# Altium integrated library HCxx.IntLib: 212 symbols (part 1 of 2)
Pins are listed as number, name and electrical type; pins without a type are passive.

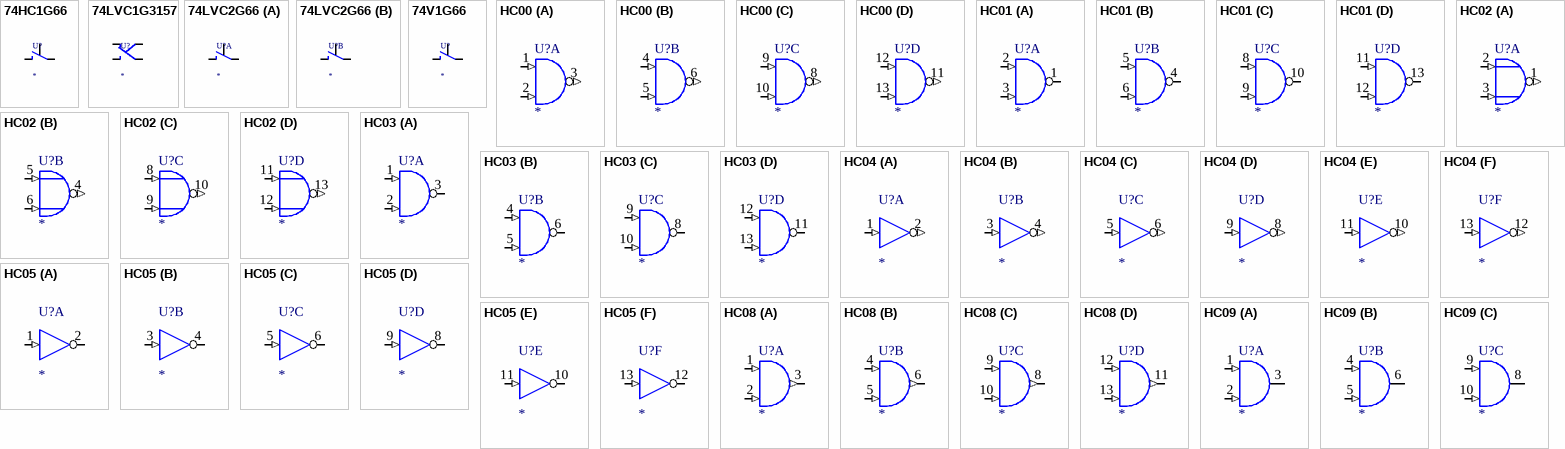
[diagram p0: symbols 74HC1G66 to HC09]

## 74HC1G66
designator U?
2-10V 75om(2V) 21om(9V)
footprint SOT353 (SOT-353/SC-88A; 5 Leads; Body 2.2 x 2.2 mm, inc. leads (LxW max))
pins: 1 y, 2 Z, 3 Vss hidden to Vss, 4 E, 5 Vcc hidden to Vcc
1 alternate drawing of the same symbol

## 74LVC1G3157
designator U?
1.65-5.5V 6om(4.5V)
footprint SOT23-6
pins: 1 0, 2 Vss hidden to Vss, 3 1, 4 Z, 5 Vcc hidden to Vcc, 6 E
1 alternate drawing of the same symbol

## 74LVC2G66
designator U?
2-5.5V 8.5om(3.3V) 6.5om(5V)
footprint SOT23-8L
part A pins: 1 y, 2 Z, 4 Vss hidden to Vss, 7 E, 8 Vcc hidden to Vcc
part B pins: 3 E, 5 y, 6 Z
1 alternate drawing of the same symbol

## 74V1G66
designator U?
2-5.5V 8.5om(3.3V) 6.5om(5V)
footprint SOT23-5
pins: 1 y, 2 Z, 3 Vss hidden to Vss, 4 E, 5 Vcc hidden to Vcc
1 alternate drawing of the same symbol

## HC00
designator U?
footprint DIL14-300
part A pins: 1 I0 (in), 2 I1 (in), 3 O (out), 7 GND (power) hidden to GND, 14 VCC (power) hidden to VCC
part B pins: 4 I0 (in), 5 I1 (in), 6 O (out)
part C pins: 8 O (out), 9 I0 (in), 10 I1 (in)
part D pins: 11 O (out), 12 I0 (in), 13 I1 (in)
1 alternate drawing of the same symbol

## HC01
designator U?
footprint DIL14-300
part A pins: 1 O (oc), 2 I0 (in), 3 I1 (in), 7 GND (power) hidden to GND, 14 VCC (power) hidden to VCC
part B pins: 4 O (oc), 5 I0 (in), 6 I1 (in)
part C pins: 8 I0 (in), 9 I1 (in), 10 O (oc)
part D pins: 11 I0 (in), 12 I1 (in), 13 O (oc)
1 alternate drawing of the same symbol

## HC02
designator U?
footprint DIL14-300
part A pins: 1 O (out), 2 I0 (in), 3 I1 (in), 7 GND (power) hidden to GND, 14 VCC (power) hidden to VCC
part B pins: 4 O (out), 5 I0 (in), 6 I1 (in)
part C pins: 8 I0 (in), 9 I1 (in), 10 O (out)
part D pins: 11 I0 (in), 12 I1 (in), 13 O (out)
1 alternate drawing of the same symbol

## HC03
designator U?
footprint DIL14-300
part A pins: 1 I0 (in), 2 I1 (in), 3 O (oc), 7 GND (power) hidden to GND, 14 VCC (power) hidden to VCC
part B pins: 4 I0 (in), 5 I1 (in), 6 O (oc)
part C pins: 8 O (oc), 9 I0 (in), 10 I1 (in)
part D pins: 11 O (oc), 12 I0 (in), 13 I1 (in)
1 alternate drawing of the same symbol

## HC04
designator U?
footprint DIL14-300
part A pins: 1 I (in), 2 O (out), 7 GND (power) hidden to GND, 14 VCC (power) hidden to VCC
part B pins: 3 I (in), 4 O (out)
part C pins: 5 I (in), 6 O (out)
part D pins: 8 O (out), 9 I (in)
part E pins: 10 O (out), 11 I (in)
part F pins: 12 O (out), 13 I (in)
1 alternate drawing of the same symbol

## HC05
designator U?
footprint DIL14-300
part A pins: 1 I (in), 2 O (oc), 7 GND (power) hidden to GND, 14 VCC (power) hidden to VCC
part B pins: 3 I (in), 4 O (oc)
part C pins: 5 I (in), 6 O (oc)
part D pins: 8 O (oc), 9 I (in)
part E pins: 10 O (oc), 11 I (in)
part F pins: 12 O (oc), 13 I (in)
1 alternate drawing of the same symbol

## HC08
designator U?
Price: 0.34
footprint DIL14-300
part A pins: 1 I0 (in), 2 I1 (in), 3 O (out), 7 GND (power) hidden to GND, 14 VCC (power) hidden to VCC
part B pins: 4 I0 (in), 5 I1 (in), 6 O (out)
part C pins: 8 O (out), 9 I0 (in), 10 I1 (in)
part D pins: 11 O (out), 12 I0 (in), 13 I1 (in)
1 alternate drawing of the same symbol

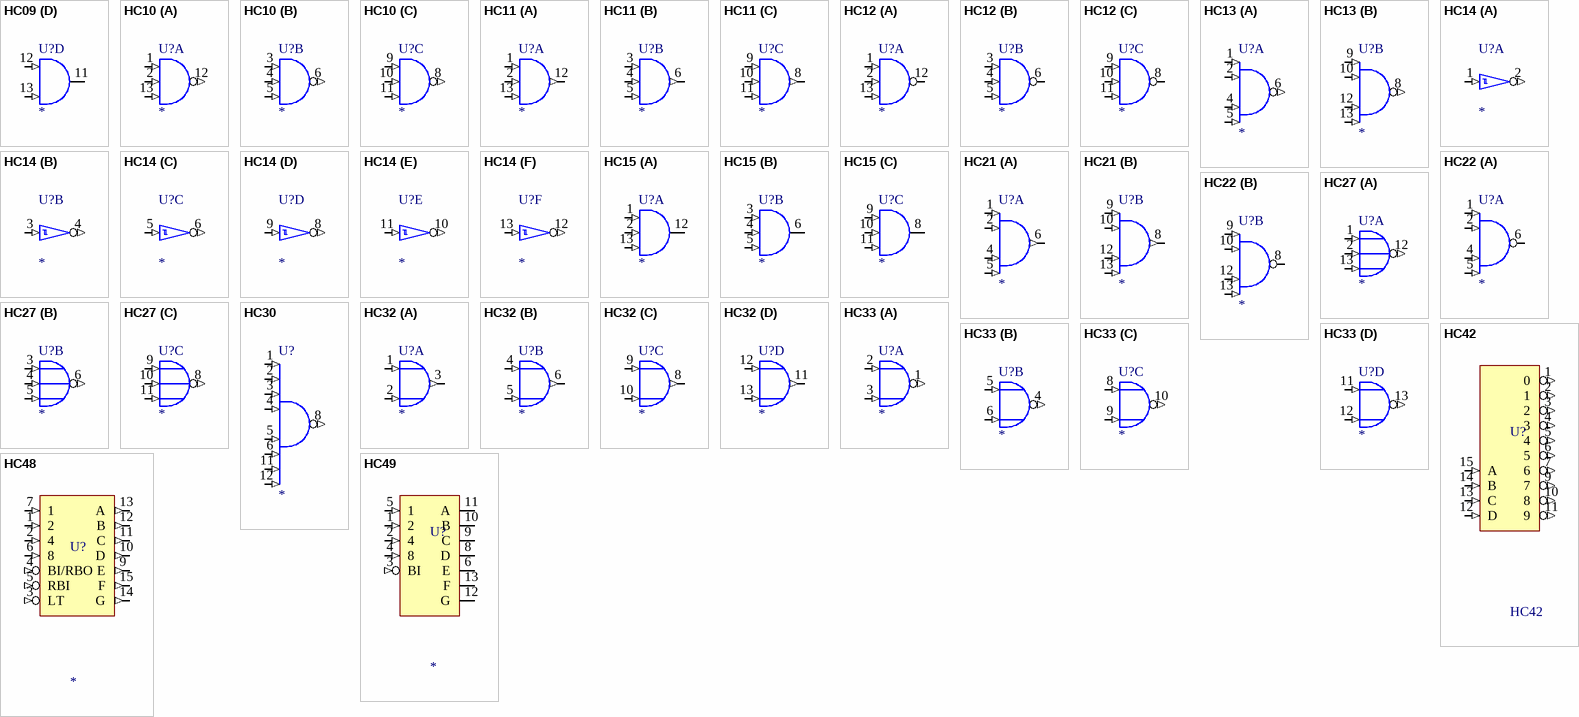
[diagram p1: symbols HC09 to HC49]

## HC09
designator U?
footprint DIL14-300
part A pins: 1 I0 (in), 2 I1 (in), 3 O (oc), 7 Gnd (power) hidden to Gnd, 14 VCC (power) hidden to VCC
part B pins: 4 I0 (in), 5 I1 (in), 6 O (oc)
part C pins: 8 O (oc), 9 I0 (in), 10 I1 (in)
part D pins: 11 O (oc), 12 I0 (in), 13 I1 (in)
1 alternate drawing of the same symbol

## HC10
designator U?
footprint DIL14-300
part A pins: 1 I0 (in), 2 I1 (in), 7 GND (power) hidden to GND, 12 O (out), 13 I2 (in), 14 VCC (power) hidden to VCC
part B pins: 3 I0 (in), 4 I1 (in), 5 I2 (in), 6 O (out)
part C pins: 8 O (out), 9 I0 (in), 10 I1 (in), 11 I2 (in)
1 alternate drawing of the same symbol

## HC11
designator U?
footprint DIL14-300
part A pins: 1 I0 (in), 2 I1 (in), 7 GND (power) hidden to GND, 12 O (out), 13 I2 (in), 14 VCC (power) hidden to VCC
part B pins: 3 I0 (in), 4 I1 (in), 5 I2 (in), 6 O (out)
part C pins: 8 O (out), 9 I0 (in), 10 I1 (in), 11 I2 (in)
1 alternate drawing of the same symbol

## HC12
designator U?
footprint DIL14-300
part A pins: 1 I0 (in), 2 I1 (in), 7 GND (power) hidden to GND, 12 O (oc), 13 I2 (in), 14 VCC (power) hidden to VCC
part B pins: 3 I0 (in), 4 I1 (in), 5 I2 (in), 6 O (oc)
part C pins: 8 O (oc), 9 I0 (in), 10 I1 (in), 11 I2 (in)
1 alternate drawing of the same symbol

## HC13
designator U?
footprint DIL14-300
part A pins: 1 I0 (in), 2 I1 (in), 4 I2 (in), 5 I3 (in), 6 O (out), 7 GND (power) hidden to GND, 14 VCC (power) hidden to VCC
part B pins: 8 O (out), 9 I0 (in), 10 I1 (in), 12 I2 (in), 13 I3 (in)
1 alternate drawing of the same symbol

## HC14
designator U?
Price: 0.38
footprint DIL14-300
footprint SO14-150
part A pins: 1 I (in), 2 O (out), 7 GND (power) hidden to GND, 14 VCC (power) hidden to VCC
part B pins: 3 I (in), 4 O (out)
part C pins: 5 I (in), 6 O (out)
part D pins: 8 O (out), 9 I (in)
part E pins: 10 O (out), 11 I (in)
part F pins: 12 O (out), 13 I (in)
1 alternate drawing of the same symbol

## HC15
designator U?
footprint DIL14-300
part A pins: 1 I0 (in), 2 I1 (in), 7 GND (power) hidden to GND, 12 O (oc), 13 I2 (in), 14 VCC (power) hidden to VCC
part B pins: 3 I0 (in), 4 I1 (in), 5 I2 (in), 6 O (oc)
part C pins: 8 O (oc), 9 I0 (in), 10 I1 (in), 11 I2 (in)
1 alternate drawing of the same symbol

## HC21
designator U?
footprint DIL14-300
part A pins: 1 I0 (in), 2 I1 (in), 4 I2 (in), 5 I3 (in), 6 O (out), 7 GND (power) hidden to GND, 14 VCC (power) hidden to VCC
part B pins: 8 O (out), 9 I0 (in), 10 I1 (in), 12 I2 (in), 13 I3 (in)
1 alternate drawing of the same symbol

## HC22
designator U?
footprint DIL14-300
part A pins: 1 I0 (in), 2 I1 (in), 4 I2 (in), 5 I3 (in), 6 O (oc), 7 GND (power) hidden to GND, 14 VCC (power) hidden to VCC
part B pins: 8 O (oc), 9 I0 (in), 10 I1 (in), 12 I2 (in), 13 I3 (in)
1 alternate drawing of the same symbol

## HC27
designator U?
footprint DIL14-300
part A pins: 1 I0 (in), 2 I1 (in), 7 GND (power) hidden to GND, 12 O (out), 13 I2 (in), 14 VCC (power) hidden to VCC
part B pins: 3 I0 (in), 4 I1 (in), 5 I2 (in), 6 O (out)
part C pins: 8 O (out), 9 I0 (in), 10 I1 (in), 11 I2 (in)
1 alternate drawing of the same symbol

## HC30
designator U?
footprint DIL14-300
pins: 1 I0 (in), 2 I1 (in), 3 I2 (in), 4 I3 (in), 5 I4 (in), 6 I5 (in), 7 GND (power) hidden to GND, 8 O (out), 11 I6 (in), 12 I7 (in), 14 VCC (power) hidden to VCC
1 alternate drawing of the same symbol

## HC32
designator U?
footprint DIL16-300
part A pins: 1 I0 (in), 2 I1 (in), 3 O (out), 7 GND (power) hidden to GND, 14 VCC (power) hidden to VCC
part B pins: 4 I0 (in), 5 I1 (in), 6 O (out)
part C pins: 8 O (out), 9 I0 (in), 10 I1 (in)
part D pins: 11 O (out), 12 I0 (in), 13 I1 (in)
1 alternate drawing of the same symbol

## HC33
designator U?
footprint DIL14-300
part A pins: 1 O (out), 2 I0 (in), 3 I1 (in), 7 GND (power) hidden to GND, 14 VCC (power) hidden to VCC
part B pins: 4 O (out), 5 I0 (in), 6 I1 (in)
part C pins: 8 I0 (in), 9 I1 (in), 10 O (out)
part D pins: 11 I0 (in), 12 I1 (in), 13 O (out)
1 alternate drawing of the same symbol

## HC42
designator U?
footprint DIL16-300
pins: 1 0 (out), 2 1 (out), 3 2 (out), 4 3 (out), 5 4 (out), 6 5 (out), 7 6 (out), 8 GND (power) hidden to GND, 9 7 (out), 10 8 (out), 11 9 (out), 12 D (in), 13 C (in), 14 B (in), 15 A (in), 16 Vcc (power) hidden to Vcc

## HC48
designator U?
footprint DIL16-300
pins: 1 2 (in), 2 4 (in), 3 LT (in), 4 BI/RBO (in), 5 RBI (in), 6 8 (in), 7 1 (in), 8 GND (power) hidden to GND, 9 E (out), 10 D (out), 11 C (out), 12 B (out), 13 A (out), 14 G (out), 15 F (out), 16 VCC (power) hidden to VCC

## HC49
designator U?
footprint DIL14-300
pins: 1 2 (in), 2 4 (in), 3 BI (in), 4 8 (in), 5 1 (in), 6 E (oc), 7 GND (power) hidden to GND, 8 D (oc), 9 C (oc), 10 B (oc), 11 A (oc), 12 G (oc), 13 F (oc), 14 VCC (power) hidden to VCC

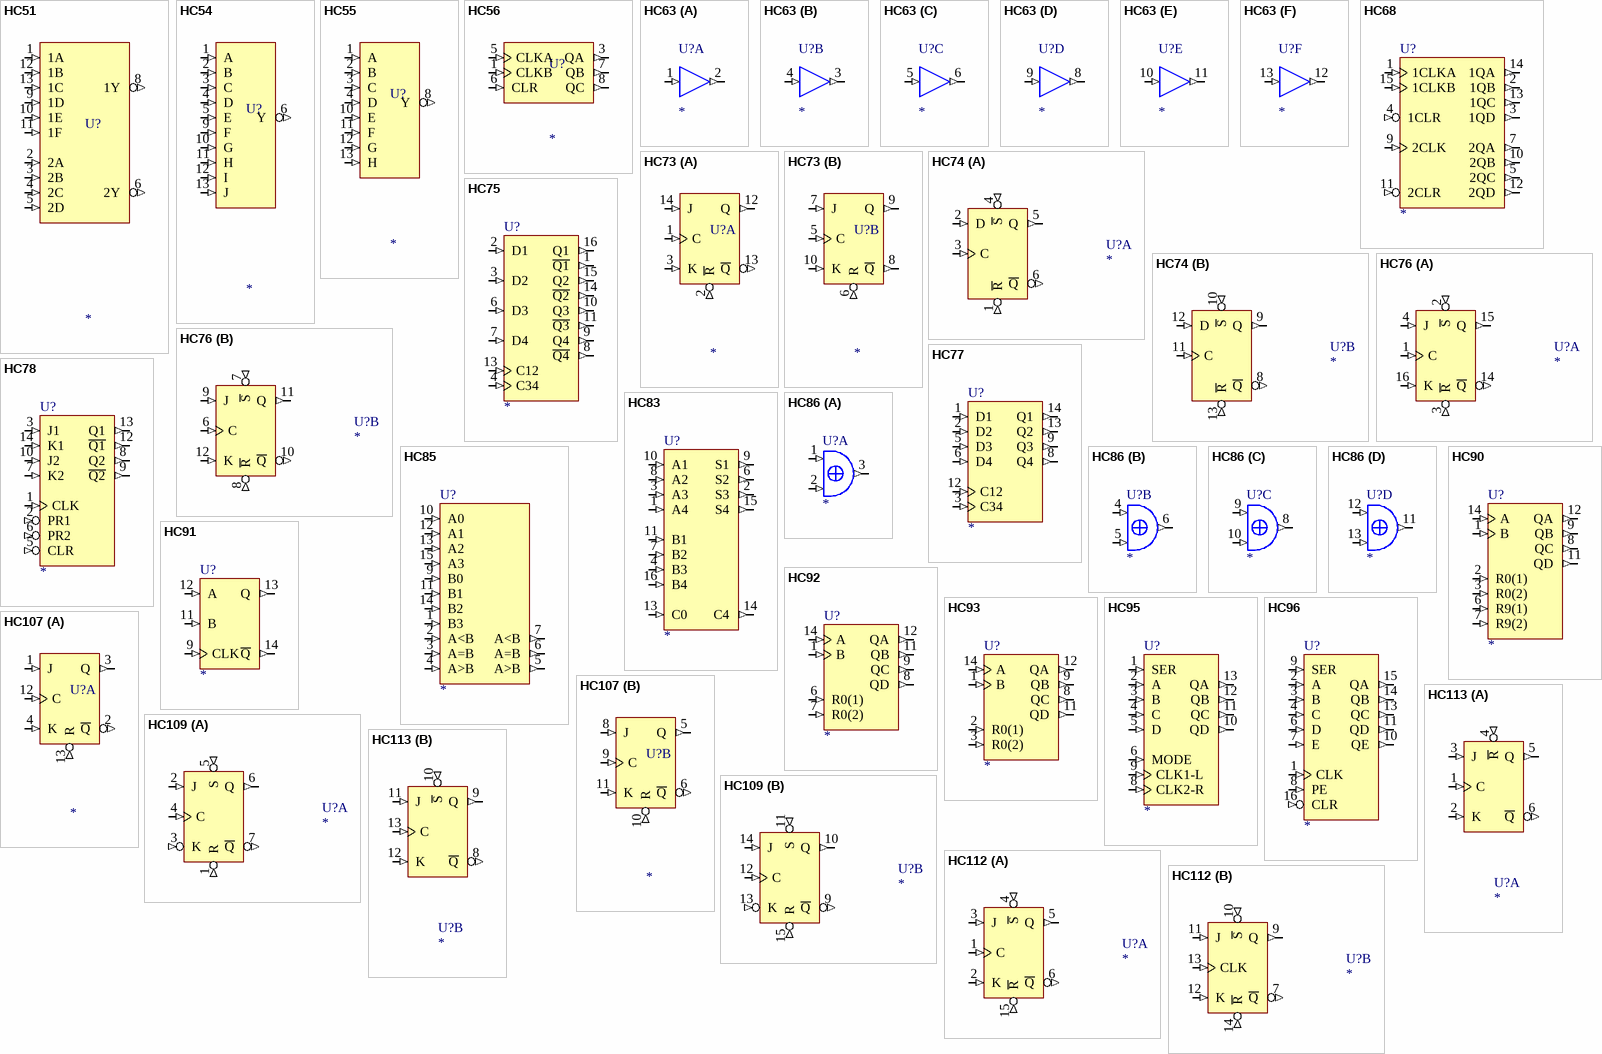
[diagram p2: symbols HC51 to HC113]

## HC51
designator U?
footprint DIL14-300
pins: 1 1A (in), 2 2A (in), 3 2B (in), 4 2C (in), 5 2D (in), 6 2Y (out), 7 GND (power) hidden to GND, 8 1Y (out), 9 1D (in), 10 1E (in), 11 1F (in), 12 1B (in), 13 1C (in), 14 VCC (power) hidden to VCC

## HC54
designator U?
footprint DIL14-300
pins: 1 A (in), 2 B (in), 3 C (in), 4 D (in), 5 E (in), 6 Y (out), 7 GND (power) hidden to GND, 9 F (in), 10 G (in), 11 H (in), 12 I (in), 13 J (in), 14 VCC (power) hidden to VCC

## HC55
designator U?
footprint DIL14-300
pins: 1 A (in), 2 B (in), 3 C (in), 4 D (in), 7 GND (power) hidden to GND, 8 Y (out), 10 E (in), 11 F (in), 12 G (in), 13 H (in), 14 VCC (power) hidden to VCC

## HC56
designator U?
footprint DIL8-300
pins: 1 CLKB (in), 2 VCC (power) hidden to VCC, 3 QA (out), 4 GND (power) hidden to GND, 5 CLKA (in), 6 CLR (in), 7 QB (out), 8 QC (out)

## HC63
designator U?
footprint DIL14-300
part A pins: 1 I (in), 2 O (out), 7 GND (power) hidden to GND, 14 VCC (power) hidden to VCC
part B pins: 3 O (out), 4 I (in)
part C pins: 5 I (in), 6 O (out)
part D pins: 8 O (out), 9 I (in)
part E pins: 10 I (in), 11 O (out)
part F pins: 12 O (out), 13 I (in)
1 alternate drawing of the same symbol

## HC68
designator U?
footprint DIL16-300
pins: 1 1CLKA (in), 2 1QB (out), 3 1QD (out), 4 1CLR (in), 5 2QC (out), 7 2QA (out), 8 GND (power) hidden to GND, 9 2CLK (in), 10 2QB (out), 11 2CLR (in), 12 2QD (out), 13 1QC (out), 14 1QA (out), 15 1CLKB (in), 16 VCC (power) hidden to VCC

## HC73
designator U?
Price: 0.54
footprint DIL14-300
part A pins: 1 C (in), 2 ~{R} (in), 3 K (in), 4 VCC (power) hidden to VCC, 11 GND (power) hidden to GND, 12 Q (out), 13 ~{Q} (out), 14 J (in)
part B pins: 5 C (in), 6 R (in), 7 J (in), 8 ~{Q} (out), 9 Q (out), 10 K (in)

## HC74
designator U?
footprint DIL14-300
part A pins: 1 ~{R} (in), 2 D (in), 3 C (in), 4 ~{S} (in), 5 Q (out), 6 ~{Q} (out), 7 GND (power) hidden to GND, 14 VCC (power) hidden to VCC
part B pins: 8 ~{Q} (out), 9 Q (out), 10 ~{S} (in), 11 C (in), 12 D (in), 13 ~{R} (in)

## HC75
designator U?
footprint DIL16-300
pins: 1 ~{Q1} (out), 2 D1 (in), 3 D2 (in), 4 C34 (in), 5 VCC (power) hidden to VCC, 6 D3 (in), 7 D4 (in), 8 ~{Q4} (out), 9 Q4 (out), 10 Q3 (out), 11 ~{Q3} (out), 12 GND (power) hidden to GND, 13 C12 (in), 14 ~{Q2} (out), 15 Q2 (out), 16 Q1 (out)

## HC76
designator U?
footprint DIL16-300
part A pins: 1 C (in), 2 ~{S} (in), 3 ~{R} (in), 4 J (in), 5 VCC (power) hidden to VCC, 13 GND (power) hidden to GND, 14 ~{Q} (out), 15 Q (out), 16 K (in)
part B pins: 6 C (in), 7 ~{S} (in), 8 ~{R} (in), 9 J (in), 10 ~{Q} (out), 11 Q (out), 12 K (in)

## HC77
designator U?
footprint DIL14-300
pins: 1 D1 (in), 2 D2 (in), 3 C34 (in), 4 VCC (power) hidden to VCC, 5 D3 (in), 6 D4 (in), 8 Q4 (out), 9 Q3 (out), 11 GND (power) hidden to GND, 12 C12 (in), 13 Q2 (out), 14 Q1 (out)

## HC78
designator U?
footprint DIL14-300
pins: 1 CLK (in), 2 PR1 (in), 3 J1 (in), 4 VCC (power) hidden to VCC, 5 CLR (in), 6 PR2 (in), 7 K2 (in), 8 Q2 (out), 9 ~{Q2} (out), 10 J2 (in), 11 GND (power) hidden to GND, 12 ~{Q1} (out), 13 Q1 (out), 14 K1 (in)

## HC83
designator U?
footprint DIL16-300
pins: 1 A4 (in), 2 S3 (out), 3 A3 (in), 4 B3 (in), 5 VCC (power) hidden to VCC, 6 S2 (out), 7 B2 (in), 8 A2 (in), 9 S1 (out), 10 A1 (in), 11 B1 (in), 12 GND (power) hidden to GND, 13 C0 (in), 14 C4 (out), 15 S4 (out), 16 B4 (in)

## HC85
designator U?
footprint DIL16-300
pins: 1 B3 (in), 2 A<B (in), 3 A=B (in), 4 A>B (in), 5 A>B (out), 6 A=B (out), 7 A<B (out), 8 GND (power) hidden to GND, 9 B0 (in), 10 A0 (in), 11 B1 (in), 12 A1 (in), 13 A2 (in), 14 B2 (in), 15 A3 (in), 16 VCC (power) hidden to VCC

## HC86
designator U?
footprint DIL14-300
part A pins: 1 I0 (in), 2 I1 (in), 3 O (out), 7 GND (power) hidden to GND, 14 VCC (power) hidden to VCC
part B pins: 4 I0 (in), 5 I1 (in), 6 O (out)
part C pins: 8 O (out), 9 I0 (in), 10 I1 (in)
part D pins: 11 O (out), 12 I0 (in), 13 I1 (in)

## HC90
designator U?
footprint DIL14-300
pins: 1 B (in), 2 R0(1) (in), 3 R0(2) (in), 5 VCC (power) hidden to VCC, 6 R9(1) (in), 7 R9(2) (in), 8 QC (out), 9 QB (out), 10 GND (power) hidden to GND, 11 QD (out), 12 QA (out), 14 A (in)

## HC91
designator U?
footprint DIL14-300
pins: 5 VCC (power) hidden to VCC, 9 CLK (in), 10 GND (power) hidden to GND, 11 B (in), 12 A (in), 13 Q (out), 14 ~{Q} (out)

## HC92
designator U?
footprint DIL14-300
pins: 1 B (in), 5 VCC (power) hidden to VCC, 6 R0(1) (in), 7 R0(2) (in), 8 QD (out), 9 QC (out), 10 GND (power) hidden to GND, 11 QB (out), 12 QA (out), 14 A (in)

## HC93
designator U?
footprint DIL14-300
pins: 1 B (in), 2 R0(1) (in), 3 R0(2) (in), 5 VCC (power) hidden to VCC, 8 QC (out), 9 QB (out), 10 GND (power) hidden to GND, 11 QD (out), 12 QA (out), 14 A (in)

## HC95
designator U?
footprint DIL14-300
pins: 1 SER (in), 2 A (in), 3 B (in), 4 C (in), 5 D (in), 6 MODE (in), 7 GND (power) hidden to GND, 8 CLK2-R (in), 9 CLK1-L (in), 10 QD (out), 11 QC (out), 12 QB (out), 13 QA (out), 14 VCC (power) hidden to VCC

## HC96
designator U?
footprint DIL16-300
pins: 1 CLK (in), 2 A (in), 3 B (in), 4 C (in), 5 VCC (power) hidden to VCC, 6 D (in), 7 E (in), 8 PE (in), 9 SER (in), 10 QE (out), 11 QD (out), 12 GND (power) hidden to GND, 13 QC (out), 14 QB (out), 15 QA (out), 16 CLR (in)

## HC107
designator U?
footprint DIL14-300
part A pins: 1 J (in), 2 ~{Q} (out), 3 Q (out), 4 K (in), 7 GND (power) hidden to GND, 12 C (in), 13 R (in), 14 VCC (power) hidden to VCC
part B pins: 5 Q (out), 6 ~{Q} (out), 8 J (in), 9 C (in), 10 R (in), 11 K (in)

## HC109
designator U?
footprint DIL16-300
part A pins: 1 R (in), 2 J (in), 3 K (in), 4 C (in), 5 S (in), 6 Q (out), 7 ~{Q} (out), 8 GND (power) hidden to GND, 16 VCC (power) hidden to VCC
part B pins: 9 ~{Q} (out), 10 Q (out), 11 S (in), 12 C (in), 13 K (in), 14 J (in), 15 R (in)

## HC112
designator U?
footprint DIL16-300
part A pins: 1 C (in), 2 K (in), 3 J (in), 4 ~{S} (in), 5 Q (out), 6 ~{Q} (out), 8 GND (power) hidden to GND, 15 ~{R} (in), 16 VCC (power) hidden to VCC
part B pins: 7 ~{Q} (out), 9 Q (out), 10 ~{S} (in), 11 J (in), 12 K (in), 13 CLK (in), 14 ~{R} (in)

## HC113
designator U?
footprint DIL14-300
part A pins: 1 C (in), 2 K (in), 3 J (in), 4 ~{R} (in), 5 Q (out), 6 ~{Q} (out), 7 GND (power) hidden to GND, 14 VCC (power) hidden to VCC
part B pins: 8 ~{Q} (out), 9 Q (out), 10 ~{S} (in), 11 J (in), 12 K (in), 13 C (in)

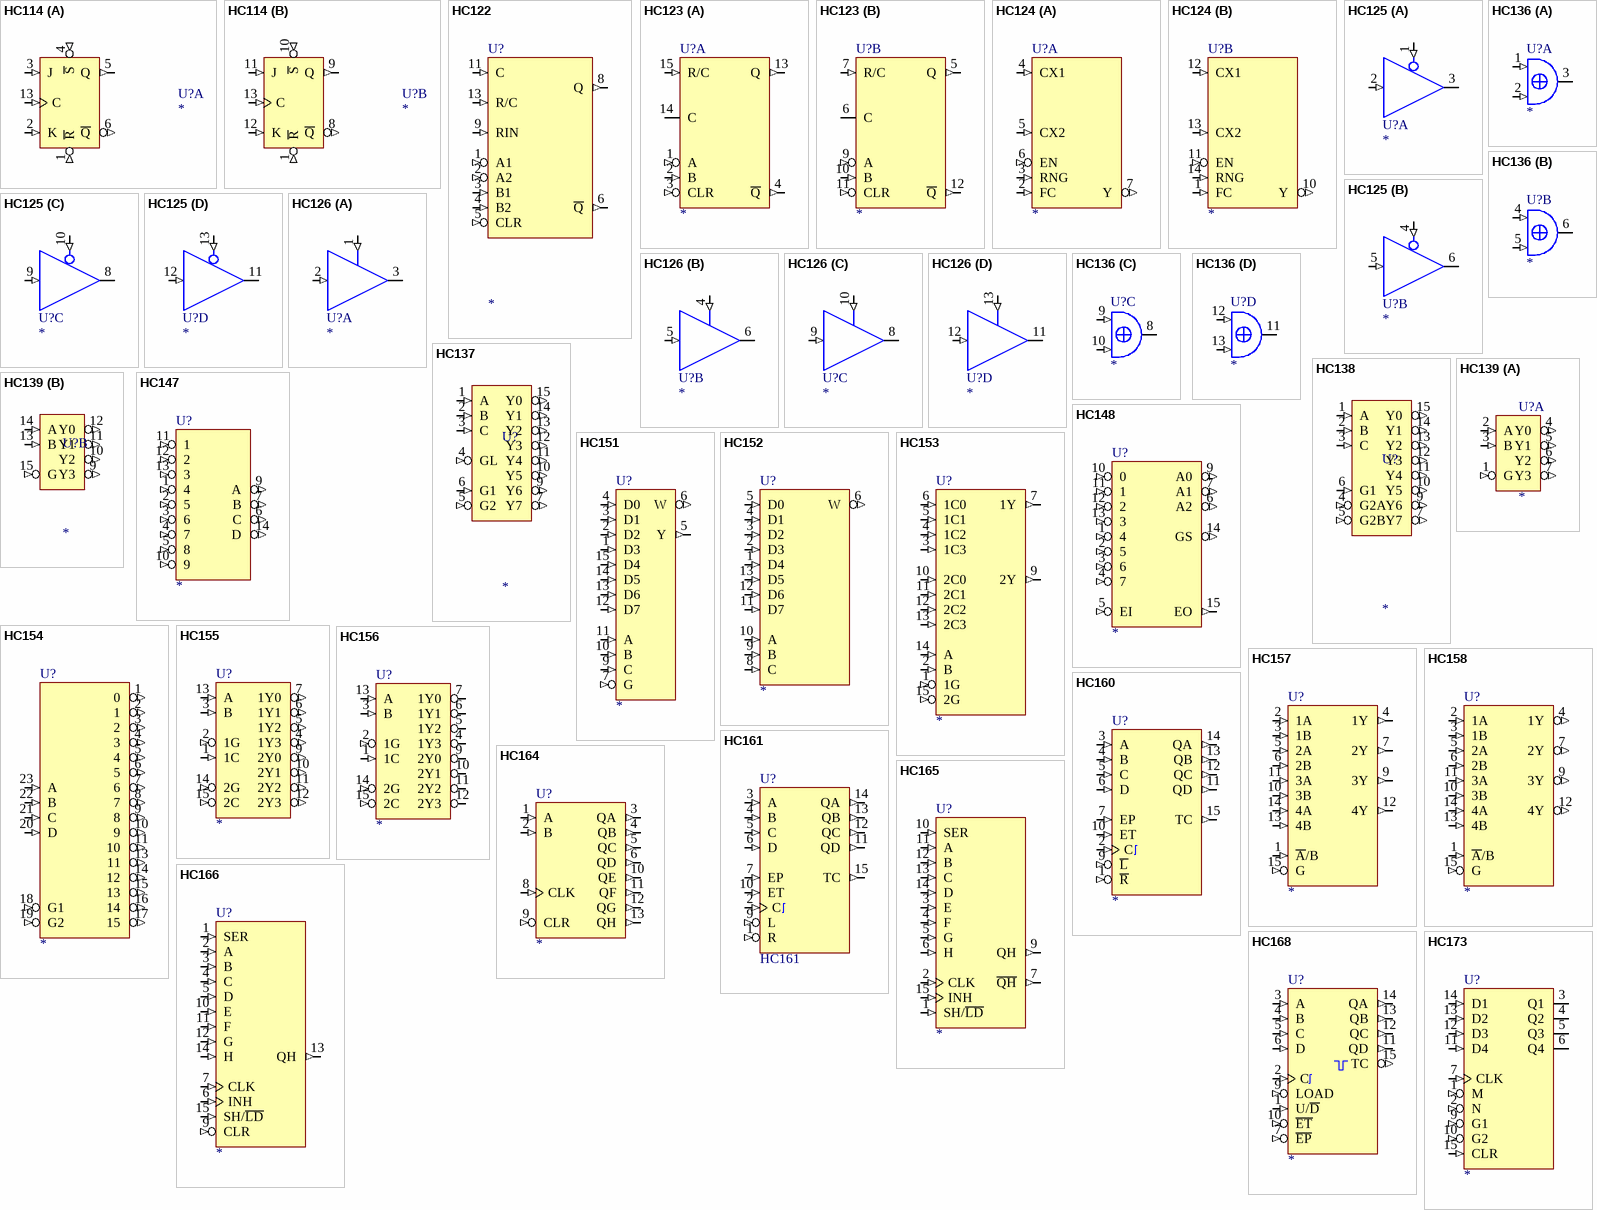
[diagram p3: symbols HC114 to HC173]

## HC114
designator U?
footprint DIL16-300
part A pins: 1 ~{R} (in), 2 K (in), 3 J (in), 4 ~{S} (in), 5 Q (out), 6 ~{Q} (out), 7 GND (power) hidden to GND, 13 C (in), 14 VCC (power) hidden to VCC
part B pins: 1 ~{R} (in), 8 ~{Q} (out), 9 Q (out), 10 ~{S} (in), 11 J (in), 12 K (in), 13 C (in)

## HC122
designator U?
footprint DIL14-300
pins: 1 A1 (in), 2 A2 (in), 3 B1 (in), 4 B2 (in), 5 CLR (in), 6 ~{Q} (out), 7 GND (power) hidden to GND, 8 Q (out), 9 RIN (in), 11 C (in), 13 R/C (in), 14 VCC (power) hidden to VCC

## HC123
designator U?
footprint DIL16-300
part A pins: 1 A (in), 2 B (in), 3 CLR (in), 4 ~{Q} (out), 8 GND (power) hidden to GND, 13 Q (out), 14 C, 15 R/C (in), 16 VCC (power) hidden to VCC
part B pins: 5 Q (out), 6 C, 7 R/C (in), 9 A (in), 10 B (in), 11 CLR (in), 12 ~{Q} (out)

## HC124
designator U?
footprint DIL16-300
part A pins: 2 FC (in), 3 RNG (in), 4 CX1 (in), 5 CX2 (in), 6 EN (in), 7 Y (out), 8 VCOGND (power) hidden to VCOGND, 9 GND (power) hidden to GND, 15 VCOVCC (power) hidden to VCOVCC, 16 VCC (power) hidden to VCC
part B pins: 1 FC (in), 10 Y (out), 11 EN (in), 12 CX1 (in), 13 CX2 (in), 14 RNG (in)

## HC125
designator U?
footprint DIL14-300
part A pins: 1 OE (in), 2 I (in), 3 O (hiz), 7 GND (power) hidden to GND, 14 VCC (power) hidden to VCC
part B pins: 4 OE (in), 5 I (in), 6 O (hiz)
part C pins: 8 O (hiz), 9 I (in), 10 OE (in)
part D pins: 11 O (hiz), 12 I (in), 13 OE (in)
1 alternate drawing of the same symbol

## HC126
designator U?
footprint DIL14-300
part A pins: 1 OE (in), 2 I (in), 3 O (hiz), 7 GND (power) hidden to GND, 14 VCC (power) hidden to VCC
part B pins: 4 OE (in), 5 I (in), 6 O (hiz)
part C pins: 8 O (hiz), 9 I (in), 10 OE (in)
part D pins: 11 O (hiz), 12 I (in), 13 OE (in)
1 alternate drawing of the same symbol

## HC136
designator U?
footprint DIL14-300
part A pins: 1 I0 (in), 2 I1 (in), 3 O (oc), 7 GND (power) hidden to GND, 14 VCC (power) hidden to VCC
part B pins: 4 I0 (in), 5 I1 (in), 6 O (oc)
part C pins: 8 O (oc), 9 I0 (in), 10 I1 (in)
part D pins: 11 O (oc), 12 I0 (in), 13 I1 (in)

## HC137
designator U?
footprint DIL16-300
pins: 1 A (in), 2 B (in), 3 C (in), 4 GL (in), 5 G2 (in), 6 G1 (in), 7 Y7 (out), 8 GND (power) hidden to GND, 9 Y6 (out), 10 Y5 (out), 11 Y4 (out), 12 Y3 (out), 13 Y2 (out), 14 Y1 (out), 15 Y0 (out), 16 VCC (power) hidden to VCC

## HC138
designator U?
Price: 0.5
footprint DIL16-300
pins: 1 A (in), 2 B (in), 3 C (in), 4 G2A (in), 5 G2B (in), 6 G1 (in), 7 Y7 (out), 8 GND (power) hidden to GND, 9 Y6 (out), 10 Y5 (out), 11 Y4 (out), 12 Y3 (out), 13 Y2 (out), 14 Y1 (out), 15 Y0 (out), 16 VCC (power) hidden to VCC

## HC139
designator U?
footprint DIL16-300
part A pins: 1 G (in), 2 A (in), 3 B (in), 4 Y0 (out), 5 Y1 (out), 6 Y2 (out), 7 Y3 (out), 8 GND (power) hidden to GND, 16 VCC (power) hidden to VCC
part B pins: 9 Y3 (out), 10 Y2 (out), 11 Y1 (out), 12 Y0 (out), 13 B (in), 14 A (in), 15 G (in)

## HC147
designator U?
footprint DIL16-300
pins: 1 4 (in), 2 5 (in), 3 6 (in), 4 7 (in), 5 8 (in), 6 C (out), 7 B (out), 8 GND (power) hidden to GND, 9 A (out), 10 9 (in), 11 1 (in), 12 2 (in), 13 3 (in), 14 D (out), 16 VCC (power) hidden to VCC

## HC148
designator U?
footprint DIL16-300
pins: 1 4 (in), 2 5 (in), 3 6 (in), 4 7 (in), 5 EI (in), 6 A2 (out), 7 A1 (out), 8 GND (power) hidden to GND, 9 A0 (out), 10 0 (in), 11 1 (in), 12 2 (in), 13 3 (in), 14 GS (out), 15 EO (out), 16 VCC (power) hidden to VCC

## HC151
designator U?
footprint DIL16-300
pins: 1 D3 (in), 2 D2 (in), 3 D1 (in), 4 D0 (in), 5 Y (out), 6 W (out), 7 G (in), 8 GND (power) hidden to GND, 9 C (in), 10 B (in), 11 A (in), 12 D7 (in), 13 D6 (in), 14 D5 (in), 15 D4 (in), 16 VCC (power) hidden to VCC
1 alternate drawing of the same symbol

## HC152
designator U?
footprint DIL16-300
pins: 1 D4 (in), 2 D3 (in), 3 D2 (in), 4 D1 (in), 5 D0 (in), 6 W (out), 7 GND (power) hidden to GND, 8 C (in), 9 B (in), 10 A (in), 11 D7 (in), 12 D6 (in), 13 D5 (in), 14 VCC (power) hidden to VCC

## HC153
designator U?
footprint DIL16-300
pins: 1 1G (in), 2 B (in), 3 1C3 (in), 4 1C2 (in), 5 1C1 (in), 6 1C0 (in), 7 1Y (out), 8 GND (power) hidden to GND, 9 2Y (out), 10 2C0 (in), 11 2C1 (in), 12 2C2 (in), 13 2C3 (in), 14 A (in), 15 2G (in), 16 VCC (power) hidden to VCC

## HC154
designator U?
footprint DIL24-300
pins: 1 0 (out), 2 1 (out), 3 2 (out), 4 3 (out), 5 4 (out), 6 5 (out), 7 6 (out), 8 7 (out), 9 8 (out), 10 9 (out), 11 10 (out), 12 GND (power) hidden to GND, 13 11 (out), 14 12 (out), 15 13 (out), 16 14 (out), 17 15 (out), 18 G1 (in), 19 G2 (in), 20 D (in), 21 C (in), 22 B (in), 23 A (in), 24 VCC (power) hidden to VCC

## HC155
designator U?
footprint DIL16-300
pins: 1 1C (in), 2 1G (in), 3 B (in), 4 1Y3 (out), 5 1Y2 (out), 6 1Y1 (out), 7 1Y0 (out), 8 GND (power) hidden to GND, 9 2Y0 (out), 10 2Y1 (out), 11 2Y2 (out), 12 2Y3 (out), 13 A (in), 14 2G (in), 15 2C (in), 16 VCC (power) hidden to VCC

## HC156
designator U?
footprint DIL16-300
pins: 1 1C (in), 2 1G (in), 3 B (in), 4 1Y3 (oc), 5 1Y2 (oc), 6 1Y1 (oc), 7 1Y0 (oc), 8 GND (power) hidden to GND, 9 2Y0 (oc), 10 2Y1 (oc), 11 2Y2 (oc), 12 2Y3 (oc), 13 A (in), 14 2G (in), 15 2C (in), 16 VCC (power) hidden to VCC

## HC157
designator U?
footprint DIL16-300
pins: 1 ~{A}/B (in), 2 1A (in), 3 1B (in), 4 1Y (out), 5 2A (in), 6 2B (in), 7 2Y (out), 8 GND (power) hidden to GND, 9 3Y (out), 10 3B (in), 11 3A (in), 12 4Y (out), 13 4B (in), 14 4A (in), 15 G (in), 16 VCC (power) hidden to VCC

## HC158
designator U?
footprint DIL16-300
pins: 1 ~{A}/B (in), 2 1A (in), 3 1B (in), 4 1Y (out), 5 2A (in), 6 2B (in), 7 2Y (out), 8 GND (power) hidden to GND, 9 3Y (out), 10 3B (in), 11 3A (in), 12 4Y (out), 13 4B (in), 14 4A (in), 15 G (in), 16 VCC (power) hidden to VCC

## HC160
designator U?
Price: 0.74
footprint DIL16-300
pins: 1 ~{R} (in), 2 C (in), 3 A (in), 4 B (in), 5 C (in), 6 D (in), 7 EP (in), 8 GND (power) hidden to GND, 9 ~{L} (in), 10 ET (in), 11 QD (out), 12 QC (out), 13 QB (out), 14 QA (out), 15 TC (out), 16 VCC (power) hidden to VCC

## HC161
designator U?
Price: 0.74
footprint DIL16-300
pins: 1 R (in), 2 C (in), 3 A (in), 4 B (in), 5 C (in), 6 D (in), 7 EP (in), 8 GND (power) hidden to GND, 9 L (in), 10 ET (in), 11 QD (out), 12 QC (out), 13 QB (out), 14 QA (out), 15 TC (out), 16 VCC (power) hidden to VCC

## HC164
designator U?
footprint DIL16-300
pins: 1 A (in), 2 B (in), 3 QA (out), 4 QB (out), 5 QC (out), 6 QD (out), 7 GND (power) hidden to GND, 8 CLK (in), 9 CLR (in), 10 QE (out), 11 QF (out), 12 QG (out), 13 QH (out), 14 VCC (power) hidden to VCC

## HC165
designator U?
footprint DIL16-300
pins: 1 SH/~{LD} (in), 2 CLK (in), 3 E (in), 4 F (in), 5 G (in), 6 H (in), 7 ~{QH} (out), 8 GND (power) hidden to GND, 9 QH (out), 10 SER (in), 11 A (in), 12 B (in), 13 C (in), 14 D (in), 15 INH (in), 16 VCC (power) hidden to VCC

## HC166
designator U?
footprint DIL16-300
pins: 1 SER (in), 2 A (in), 3 B (in), 4 C (in), 5 D (in), 6 INH (in), 7 CLK (in), 8 GND (power) hidden to GND, 9 CLR (in), 10 E (in), 11 F (in), 12 G (in), 13 QH (out), 14 H (in), 15 SH/~{LD} (in), 16 VCC (power) hidden to VCC

## HC168
designator U?
footprint DIL16-300
pins: 1 U/~{D} (in), 2 C (in), 3 A (in), 4 B (in), 5 C (in), 6 D (in), 7 ~{EP} (in), 8 GND (power) hidden to GND, 9 LOAD (in), 10 ~{ET} (in), 11 QD (out), 12 QC (out), 13 QB (out), 14 QA (out), 15 TC (out), 16 VCC (power) hidden to VCC

## HC173
designator U?
footprint DIL16-300
pins: 1 M (in), 2 N (in), 3 Q1 (hiz), 4 Q2 (hiz), 5 Q3 (hiz), 6 Q4 (hiz), 7 CLK (in), 8 GND (power) hidden to GND, 9 G1 (in), 10 G2 (in), 11 D4 (in), 12 D3 (in), 13 D2 (in), 14 D1 (in), 15 CLR (in), 16 VCC (power) hidden to VCC
